# Altium footprint library IC.PcbLib: 386 footprints (part 27 of 30)
Each footprint in its own frame and in the unit in brackets; x right, y up, seen from the top. Pads: shape width x height; smd on the part's side, far side on the other; paste and mask are expansions set on the pad; w line width, h text height; cw(c..) or ccw(c..) is an arc to the next point about the centre after c.
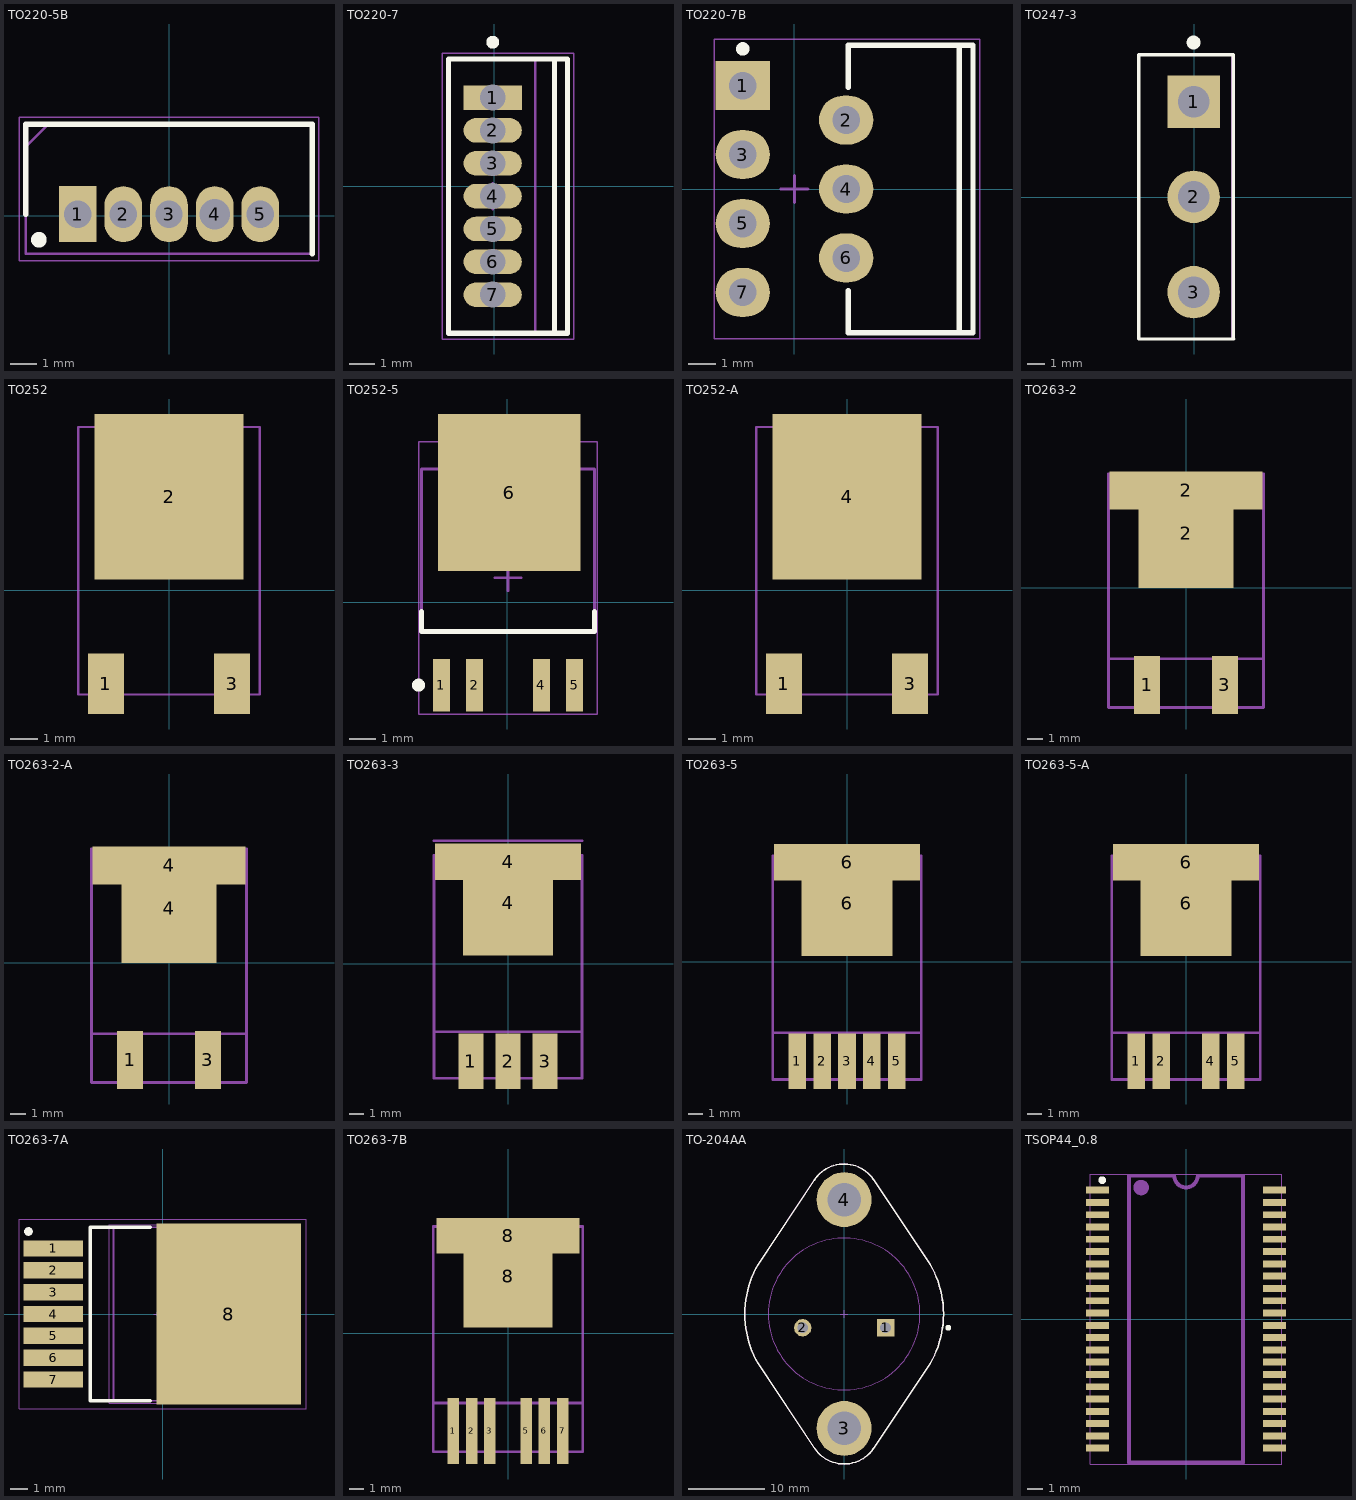
[diagram p26: the footprints below, top view; thin cyan lines are the x and y axes]

## TO220-5B [mil]
pads (5):
  rect 55x82.09 hole 40: 1(-133.86,2)
  oval 55x82.09 hole 40: 2(-66.93,2) 3(0,2) 5(133.86,2)
  oval 55x82.09 hole 45: 4(66.93,2)
Top Overlay:
  circle w20: c-190.79,-35.41 r1.38
  lines w7.87: -210.04,2 -210.04,134.09 210.04,134.09 210.04,-56.07
Mechanical 13:
  lines w3.94: -210.04,100.62 -176.57,134.09 ; -210.04,-56.07 -210.04,134.09 210.04,134.09 210.04,-56.07 -210.04,-56.07
Mechanical 15:
  lines w1.97: -219.88,-65.91 -219.88,143.93 219.88,143.93 219.88,-65.91 -219.88,-65.91
3D body "LM2577T-12_NOPB.stp": height 658.86, standoff -587.4, extent -200,-56.07 200,134.09

## TO220-7 [mm]
pads (7):
  rect 2.25x0.95 hole 1: 1(-0.065,3.419)
  oval 2.25x0.95 hole 1: 2(-0.065,2.149) 3(-0.065,0.879) 4(-0.065,-0.391) 5(-0.065,-1.661) 6(-0.065,-2.931) 7(-0.065,-4.201)
Top Overlay:
  circle w0.25: c-0.065,5.559 r0.125
  lines w0.2: 2.325,-5.691 2.325,4.909 ; -1.775,-5.691 -1.775,4.909 2.825,4.909 2.825,-5.691 -1.775,-5.691
Mechanical 13:
  lines w0.1: 1.575,-5.666 1.575,4.884 ; -1.775,-5.666 2.825,-5.666 2.825,4.884 -1.775,4.884 -1.775,-5.666
Mechanical 15:
  lines w0.05: -2.025,-5.916 3.075,-5.916 3.075,5.134 -2.025,5.134 -2.025,-5.916
  lines w0.1: -0.565,-0.391 0.435,-0.391 ; -0.065,-0.891 -0.065,0.109
3D body: height 15.75, standoff 14.78, extent 1.575,-5.666 2.825,4.884
3D body: height 13.23, standoff 12.85, extent 1.575,-5.666 2.825,-2.316
3D body: height 13.23, standoff 12.85, extent 1.575,1.534 2.825,4.884
3D body: height 12.85, standoff 12.47, extent 1.575,-5.666 2.825,-2.316
3D body: height 12.85, standoff 12.47, extent 1.575,1.534 2.825,4.884
3D body: height 13.59, standoff 13.23, extent 1.575,-5.666 2.825,-2.279
3D body: height 13.59, standoff 13.23, extent 1.575,1.497 2.825,4.884
3D body: height 12.48, standoff 12.11, extent 1.575,-5.666 2.825,-2.279
3D body: height 12.48, standoff 12.11, extent 1.575,1.497 2.825,4.884
3D body: height 13.92, standoff 13.59, extent 1.575,-5.666 2.825,-2.169
3D body: height 13.92, standoff 13.59, extent 1.575,1.387 2.825,4.884
3D body: height 12.12, standoff 11.78, extent 1.575,-5.666 2.825,-2.169
3D body: height 12.12, standoff 11.78, extent 1.575,1.387 2.825,4.884
3D body: height 14.22, standoff 13.92, extent 1.575,-5.666 2.825,-1.992
3D body: height 14.22, standoff 13.92, extent 1.575,1.21 2.825,4.884
3D body: height 11.79, standoff 11.49, extent 1.575,-5.666 2.825,-1.992
3D body: height 11.79, standoff 11.49, extent 1.575,1.21 2.825,4.884
3D body: height 14.46, standoff 14.21, extent 1.575,-5.666 2.825,-1.752
3D body: height 14.46, standoff 14.21, extent 1.575,0.97 2.825,4.884
3D body: height 11.49, standoff 11.25, extent 1.575,-5.666 2.825,-1.752
3D body: height 11.49, standoff 11.25, extent 1.575,0.97 2.825,4.884
3D body: height 14.63, standoff 14.45, extent 1.575,-5.666 2.825,-1.46
3D body: height 14.63, standoff 14.45, extent 1.575,0.678 2.825,4.884
3D body: height 11.25, standoff 11.07, extent 1.575,-5.666 2.825,-1.46
3D body: height 11.25, standoff 11.07, extent 1.575,0.678 2.825,4.884
3D body: height 14.74, standoff 14.63, extent 1.575,-5.666 2.825,-1.128
3D body: height 14.74, standoff 14.63, extent 1.575,0.346 2.825,4.884
3D body: height 11.08, standoff 10.96, extent 1.575,-5.666 2.825,-1.128
3D body: height 11.08, standoff 10.96, extent 1.575,0.346 2.825,4.884
3D body: height 14.78, standoff 14.74, extent 1.575,-5.666 2.825,-0.767
3D body: height 14.78, standoff 14.74, extent 1.575,-0.015 2.825,4.884
3D body: height 10.97, standoff 10.93, extent 1.575,-5.666 2.825,-0.767
3D body: height 10.97, standoff 10.93, extent 1.575,-0.015 2.825,4.884
3D body: height 10.93, standoff 9.4, extent 1.575,-5.666 2.825,4.884
3D body: height 9.4, standoff 0, extent -1.775,-5.666 2.825,4.884
3D body: height 0, standoff -1.6, extent -0.295,-4.596 0.165,-3.806
3D body: height 0, standoff -1.6, extent -0.295,-3.326 0.165,-2.536
3D body: height 0, standoff -1.6, extent -0.295,-2.056 0.165,-1.266
3D body: height 0, standoff -1.6, extent -0.295,-0.786 0.165,0.004
3D body: height 0, standoff -1.6, extent -0.295,0.484 0.165,1.274
3D body: height 0, standoff -1.6, extent -0.295,1.754 0.165,2.544
3D body: height 0, standoff -1.6, extent -0.295,3.024 0.165,3.814

## TO220-7B [mm]
pads (7):
  rect 2x1.8 hole 1.016: 1(-1.89,3.82)
  oval 2x1.8 hole 1.016: 2(1.92,2.55) 3(-1.89,1.28) 4(1.92,0.01) 5(-1.89,-1.26) 6(1.92,-2.53) 7(-1.89,-3.8)
Top Overlay:
  circle w0.25: c-1.89,5.17 r0.125
  lines w0.2: 1.99,-3.73 1.99,-5.29 6.59,-5.29 6.59,5.31 1.99,5.31 1.99,3.75 ; 6.09,-5.29 6.09,5.31
Mechanical 15:
  lines w0.05: -2.94,-5.515 -2.94,5.535 6.84,5.535 6.84,-5.515 -2.94,-5.515
  lines w0.1: -0.485,0.01 0.515,0.01 ; 0.015,-0.49 0.015,0.51
3D body "User Library-TO-220-7.step": height 21.3, standoff -2.22, extent -2.048,-5.156 4.69,5.004

## TO247-3 [mm]
pads (3):
  rect 3x3 hole 1.8: 1(-0.041,5.474)
  round 3 hole 1.8: 2(-0.041,0.014) 3(-0.041,-5.446)
Top Overlay:
  circle w0.4: c-0.04,8.87 r0.2
  lines w0.2: 2.23,8.164 -3.18,8.164 -3.18,-8.136 2.25,-8.136 ; 2.239,-8.136 2.239,8.164
Mechanical 13:
  lines w0.1: -3.21,-8.136 -3.21,8.164 2.14,8.164 2.14,-8.136 -3.21,-8.136
3D body "User Library-TO247.STEP": height 27.16, standoff -14.75, extent -3.19,-8.11 2.11,8.15

## TO252 [mm]
height 2.39
pads (3):
  rect 1.3x2.2 smd: 1(-2.29,-3.389) 3(2.29,-3.389)
  rect 5.4x6 smd paste-3.048: 2(0,3.39)
Top Paste:
  rectangle: -2.565,5.461 2.565,6.274
  rectangle: -2.261,4.547 -1.372,5.131
  rectangle: 1.321,4.547 2.21,5.131
  rectangle: -1.067,4.547 -0.178,5.131
  rectangle: 0.127,4.547 1.016,5.131
  rectangle: 0.127,3.708 1.016,4.293
  rectangle: -1.067,3.708 -0.178,4.293
  rectangle: 1.321,3.708 2.21,4.293
  rectangle: -2.261,3.708 -1.372,4.293
  rectangle: 0.127,2.87 1.016,3.454
  rectangle: -1.067,2.87 -0.178,3.454
  rectangle: 1.321,2.87 2.21,3.454
  rectangle: -2.261,2.87 -1.372,3.454
  rectangle: 0.127,2.032 1.016,2.616
  rectangle: -1.067,2.032 -0.178,2.616
  rectangle: 1.321,2.032 2.21,2.616
  rectangle: -2.261,2.032 -1.372,2.616
  rectangle: 0.127,1.194 1.016,1.778
  rectangle: -1.067,1.194 -0.178,1.778
Mechanical 15:
  lines w0.076: -3.29,-3.785 3.29,-3.785 3.29,5.915 -3.29,5.915 -3.29,-3.785
3D body "TO-252_2.STEP": height 2.3, standoff 0, extent -3.29,-3.785 3.29,5.915

## TO252-5 [mm]
height 2.39
pads (5):
  rect 0.65x2 smd: 1(-2.515,-3.16) 2(-1.245,-3.16) 4(1.295,-3.16) 5(2.565,-3.16)
  rect 5.45x6 smd: 6(0.076,4.191)
Top Overlay:
  circle w0.25: c-3.39,-3.16 r0.125
  lines w0.2: -3.275,-0.36 -3.275,-1.11 3.325,-1.11 3.325,-0.36
Mechanical 13:
  lines w0.1: -3.275,-1.11 3.325,-1.11 3.325,5.09 -3.275,5.09 -3.275,-1.11
Mechanical 15:
  lines w0.05: -3.375,-4.26 3.425,-4.26 3.425,6.14 -3.375,6.14 -3.375,-4.26
  lines w0.1: -0.475,0.94 0.525,0.94 ; 0.025,0.44 0.025,1.44
3D body "User Library-TO252-4L.STEP": height 2.3, standoff -0.01, extent -3.196,-3.438 3.304,6.362

## TO252-A [mm]
height 2.39
pads (3):
  rect 1.3x2.2 smd: 1(-2.29,-3.389) 3(2.29,-3.389)
  rect 5.4x6 smd paste-3.048: 4(0,3.39)
Top Paste:
  rectangle: -2.565,5.461 2.565,6.274
  rectangle: -2.261,4.547 -1.372,5.131
  rectangle: 1.321,4.547 2.21,5.131
  rectangle: -1.067,4.547 -0.178,5.131
  rectangle: 0.127,4.547 1.016,5.131
  rectangle: 0.127,3.708 1.016,4.293
  rectangle: -1.067,3.708 -0.178,4.293
  rectangle: 1.321,3.708 2.21,4.293
  rectangle: -2.261,3.708 -1.372,4.293
  rectangle: 0.127,2.87 1.016,3.454
  rectangle: -1.067,2.87 -0.178,3.454
  rectangle: 1.321,2.87 2.21,3.454
  rectangle: -2.261,2.87 -1.372,3.454
  rectangle: 0.127,2.032 1.016,2.616
  rectangle: -1.067,2.032 -0.178,2.616
  rectangle: 1.321,2.032 2.21,2.616
  rectangle: -2.261,2.032 -1.372,2.616
  rectangle: 0.127,1.194 1.016,1.778
  rectangle: -1.067,1.194 -0.178,1.778
Mechanical 15:
  lines w0.076: -3.29,-3.785 3.29,-3.785 3.29,5.915 -3.29,5.915 -3.29,-3.785
3D body "TO-252_2.STEP": height 2.3, standoff 0, extent -3.29,-3.785 3.29,5.915

## TO263-2 [mm]
pads (4):
  rect 1.7x3.8 smd: 1(-2.54,-6.37) 3(2.54,-6.37)
  rect 6.2x7.2 smd paste-5: 2(0,3.563)
  rect 10x2.5 smd paste-5: 2(0,6.37)
Top Paste:
  region: 4.039,6.083 0.279,6.083 0.279,5.182 4.039,5.182
  rectangle: -2.769,3.696 -0.279,4.889
  rectangle: -4.039,5.182 -0.279,6.083
  rectangle: -4.547,6.363 -0.279,7.556
  region: 4.547,7.556 0.279,7.556 0.279,6.363 4.547,6.363
  region: 2.769,4.889 0.279,4.889 0.279,3.696 2.769,3.696
  rectangle: -1.676,2.73 -0.279,3.416
  region: 1.676,3.416 0.279,3.416 0.279,2.73 1.676,2.73
Mechanical 15:
  lines w0.178: -5.069,-4.649 5.069,-4.649 ; -5.069,-7.849 5.069,-7.849 5.069,7.451 -5.069,7.451 -5.069,-7.849
3D body "TO-263-2.STEP": height 4.88, standoff -0.13, extent -5.08,-7.713 5.08,7.551

## TO263-2-A [mm]
pads (4):
  rect 1.7x3.8 smd: 1(-2.54,-6.37) 3(2.54,-6.37)
  rect 6.2x7.2 smd paste-5: 4(0,3.563)
  rect 10x2.5 smd paste-5: 4(0,6.37)
Top Paste:
  region: 1.676,3.416 0.279,3.416 0.279,2.73 1.676,2.73
  rectangle: -1.676,2.73 -0.279,3.416
  region: 2.769,4.889 0.279,4.889 0.279,3.696 2.769,3.696
  region: 4.547,7.556 0.279,7.556 0.279,6.363 4.547,6.363
  rectangle: -4.547,6.363 -0.279,7.556
  rectangle: -4.039,5.182 -0.279,6.083
  rectangle: -2.769,3.696 -0.279,4.889
  region: 4.039,6.083 0.279,6.083 0.279,5.182 4.039,5.182
Mechanical 15:
  lines w0.178: -5.069,-4.649 5.069,-4.649 ; -5.069,-7.849 -5.069,7.451 5.069,7.451 5.069,-7.849 -5.069,-7.849
3D body "TO-263-2.STEP": height 4.88, standoff -0.13, extent -5.08,-7.713 5.08,7.551

## TO263-3 [mm]
pads (5):
  rect 1.7x3.8 smd: 1(-2.54,-6.675) 2(0,-6.675) 3(2.54,-6.675)
  rect 6.2x7.2 smd paste-5: 4(0,4.173)
  rect 10x2.5 smd paste-5: 4(0,6.98)
Top Paste:
  region: 1.676,4.407 0.279,4.407 0.279,3.721 1.676,3.721
  rectangle: -1.676,3.721 -0.279,4.407
  region: 2.769,5.88 0.279,5.88 0.279,4.686 2.769,4.686
  region: 4.547,8.547 0.279,8.547 0.279,7.353 4.547,7.353
  rectangle: -4.547,7.353 -0.279,8.547
  rectangle: -4.039,6.172 -0.279,7.074
  rectangle: -2.769,4.686 -0.279,5.88
  region: 4.039,7.074 0.279,7.074 0.279,6.172 4.039,6.172
Mechanical 15:
  lines w0.178: -5.069,-4.649 5.069,-4.649 ; -5.069,7.451 -5.069,-7.849 5.069,-7.849 5.069,7.451 ; -5.069,8.442 5.069,8.442
3D body "TO-263-3B.STEP": height 4.6, standoff 0, extent -5.15,-7.631 5.15,7.469

## TO263-5 [mm]
pads (7):
  rect 1.2x3.8 smd: 1(-3.4,-6.803) 2(-1.7,-6.803) 3(0,-6.803) 4(1.7,-6.803) 5(3.4,-6.803)
  rect 6.2x7.2 smd paste-5: 6(0,3.997)
  rect 10x2.5 smd paste-5: 6(0,6.803)
Top Paste:
  region: 1.676,3.848 0.279,3.848 0.279,3.162 1.676,3.162
  rectangle: -1.676,3.162 -0.279,3.848
  region: 2.769,5.321 0.279,5.321 0.279,4.127 2.769,4.127
  region: 4.547,7.988 0.279,7.988 0.279,6.794 4.547,6.794
  rectangle: -4.547,6.794 -0.279,7.988
  rectangle: -4.039,5.613 -0.279,6.515
  rectangle: -2.769,4.127 -0.279,5.321
  region: 4.039,6.515 0.279,6.515 0.279,5.613 4.039,5.613
Mechanical 15:
  lines w0.178: -5.069,-4.853 5.069,-4.853 ; -5.069,-8.053 5.069,-8.053 5.069,7.247 -5.069,7.247 -5.069,-8.053
3D body "TO-263-5.STEP": height 4.56, standoff 0, extent -5.08,-7.293 5.08,6.722

## TO263-5-A [mm]
pads (6):
  rect 1.2x3.8 smd: 1(-3.4,-6.803) 2(-1.7,-6.803) 4(1.7,-6.803) 5(3.4,-6.803)
  rect 6.2x7.2 smd paste-5: 6(0,3.997)
  rect 10x2.5 smd paste-5: 6(0,6.803)
Top Paste:
  region: 4.039,6.515 0.279,6.515 0.279,5.613 4.039,5.613
  rectangle: -2.769,4.127 -0.279,5.321
  rectangle: -4.039,5.613 -0.279,6.515
  rectangle: -4.547,6.794 -0.279,7.988
  region: 4.547,7.988 0.279,7.988 0.279,6.794 4.547,6.794
  region: 2.769,5.321 0.279,5.321 0.279,4.127 2.769,4.127
  rectangle: -1.676,3.162 -0.279,3.848
  region: 1.676,3.848 0.279,3.848 0.279,3.162 1.676,3.162
Mechanical 15:
  lines w0.178: -5.069,-4.853 5.069,-4.853 ; -5.069,-8.053 -5.069,7.247 5.069,7.247 5.069,-8.053 -5.069,-8.053
3D body "User Library-TO263-5S.STEP": height 4.88, standoff 0.08, extent -5,-8.063 5,7.607

## TO263-7A [mm]
pads (8):
  rect 3.45x0.95 smd: 1(-6.35,3.81) 2(-6.35,2.54) 3(-6.35,1.27) 4(-6.35,0) 5(-6.35,-1.27) 6(-6.35,-2.54) 7(-6.35,-3.81)
  rect 8.4x10.5 smd: 8(3.85,0)
Top Overlay:
  circle w0.25: c-7.8,4.8 r0.125
  lines w0.2: -0.7,-5.05 -4.2,-5.05 -4.2,5.05 -0.7,5.05
Mechanical 13:
  lines w0.1: 6.04,5.047 6.561,5.047 7.62,3.874 7.62,-3.875 6.561,-5.048 6.04,-5.048 ; 6.04,-5.048 6.04,5.048 -2.85,5.048 -2.85,-5.048 6.04,-5.048
Mechanical 15:
  circle w0.05: c0,0 r0.35
  lines w0.001: -3.105,-5.205 -3.105,5.205 6.295,5.205 6.295,-5.205 -3.105,-5.205
  lines w0.05: -0.5,0 0.5,0 ; 0,-0.5 0,0.5 ; -8.35,-5.5 -8.35,5.5 8.35,5.5 8.35,-5.5 -8.35,-5.5
3D body "D2PAK-7.STEP": height 4.5, standoff 0, extent -7.67,-5.149 8.004,5.251

## TO263-7B [mm]
pads (8):
  rect 0.8x4.6 smd: 1(-3.81,-6.803) 2(-2.54,-6.803) 3(-1.27,-6.803) 5(1.27,-6.803) 6(2.54,-6.803) 7(3.81,-6.803)
  rect 6.2x7.2 smd paste-5: 8(0,3.997)
  rect 10x2.5 smd paste-5: 8(0,6.803)
Top Paste:
  region: 4.039,6.515 0.279,6.515 0.279,5.613 4.039,5.613
  rectangle: -2.769,4.127 -0.279,5.321
  rectangle: -4.039,5.613 -0.279,6.515
  rectangle: -4.547,6.794 -0.279,7.988
  region: 4.547,7.988 0.279,7.988 0.279,6.794 4.547,6.794
  region: 2.769,5.321 0.279,5.321 0.279,4.127 2.769,4.127
  rectangle: -1.676,3.162 -0.279,3.848
  region: 1.676,3.848 0.279,3.848 0.279,3.162 1.676,3.162
Mechanical 15:
  lines w0.178: -5.069,-4.853 5.069,-4.853 ; -5.207,-8.251 5.207,-8.251 5.207,7.446 -5.207,7.446 -5.207,-8.251
3D body "D2PAK-7.STEP": height 4.5, standoff 0, extent -5.2,-8.24 5.2,7.434

## TO-204AA [mm]
pads (4):
  rect 2.3x2.3 hole 1.4: 1(5.435,-1.752)
  round 2.3 hole 1.4: 2(-5.485,-1.752)
  round 7.25 hole 4.4: 3(-0.025,-15.011) 4(-0.025,15.138)
Top Overlay:
  circle w0.508: c13.703,-1.753 r0.125
  lines w0.2: -3.967,17.698 cw(c-0.025,15.138) 3.825,17.834 ; -3.875,-17.707 ccw(c-0.025,-15.011) 3.825,-17.707 ; -3.875,-17.708 -11.37,-6.486 cw(c-0.025,0.064) -11.37,6.613 -3.875,17.835 ; 3.825,-17.708 11.32,-6.486 ccw(c-0.025,0.064) 11.32,6.613 3.825,17.835
Mechanical 13:
  circle w0.1: c-0.025,0.064 r10
  lines w0.1: -3.967,17.698 cw(c-0.025,15.138) 3.825,17.834 ; -3.875,-17.707 ccw(c-0.025,-15.011) 3.825,-17.707 ; -3.875,-17.708 -11.37,-6.486 cw(c-0.025,0.064) -11.37,6.613 -3.875,17.835 ; 3.825,-17.708 11.32,-6.486 ccw(c-0.025,0.064) 11.32,6.613 3.825,17.835
Mechanical 15:
  lines w0.1: -0.525,0.064 0.475,0.064 ; -0.025,-0.436 -0.025,0.564
3D body "User Library-TO-3_Long.STEP": height 8.5, standoff -12, extent -13.259,-19.731 12.919,19.859

## TSOP44_0.8 [mm]
height 0.254
pads (44):
  rect 1.5x0.45 smd: 1(-5.755,8.4) 2(-5.755,7.6) 3(-5.755,6.8) 4(-5.755,6) 5(-5.755,5.2) 6(-5.755,4.4) 7(-5.755,3.6) 8(-5.755,2.8) 9(-5.755,2) 10(-5.755,1.2) 11(-5.755,0.4) 12(-5.755,-0.4) 13(-5.755,-1.2) 14(-5.755,-2) 15(-5.755,-2.8) 16(-5.755,-3.6) 17(-5.755,-4.4) 18(-5.755,-5.2) 19(-5.755,-6) 20(-5.755,-6.8) 21(-5.755,-7.6) 22(-5.755,-8.4) 23(5.755,-8.4) 24(5.755,-7.6) 25(5.755,-6.8) 26(5.755,-6) 27(5.755,-5.2) 28(5.755,-4.4) 29(5.755,-3.6) 30(5.755,-2.8) 31(5.755,-2) 32(5.755,-1.2) 33(5.755,-0.4) 34(5.755,0.4) 35(5.755,1.2) 36(5.755,2) 37(5.755,2.8) 38(5.755,3.6) 39(5.755,4.4) 40(5.755,5.2) 41(5.755,6) 42(5.755,6.8) 43(5.755,7.6) 44(5.755,8.4)
Top Overlay:
  circle w0.25: c-5.45,9.049 r0.125
Mechanical 15:
  circle w0.6: c-2.921,8.566 r0.2
  lines w0.076: -6.248,-9.43 6.248,-9.43 6.248,9.43 -6.248,9.43 -6.248,-9.43
  lines w0.254: -3.715,-9.34 3.715,-9.34 3.715,9.34 0.762,9.34 cw(c0,9.34) -0.762,9.34 -3.715,9.34 -3.715,-9.34
3D body "TSOP44-0.8.STEP": height 1.3, standoff -0.09, extent -5.88,-9.117 5.88,9.093